# Altium schematic symbol library BARKO_SCHLIB.SchLib: 1064 symbols (part 3 of 11)
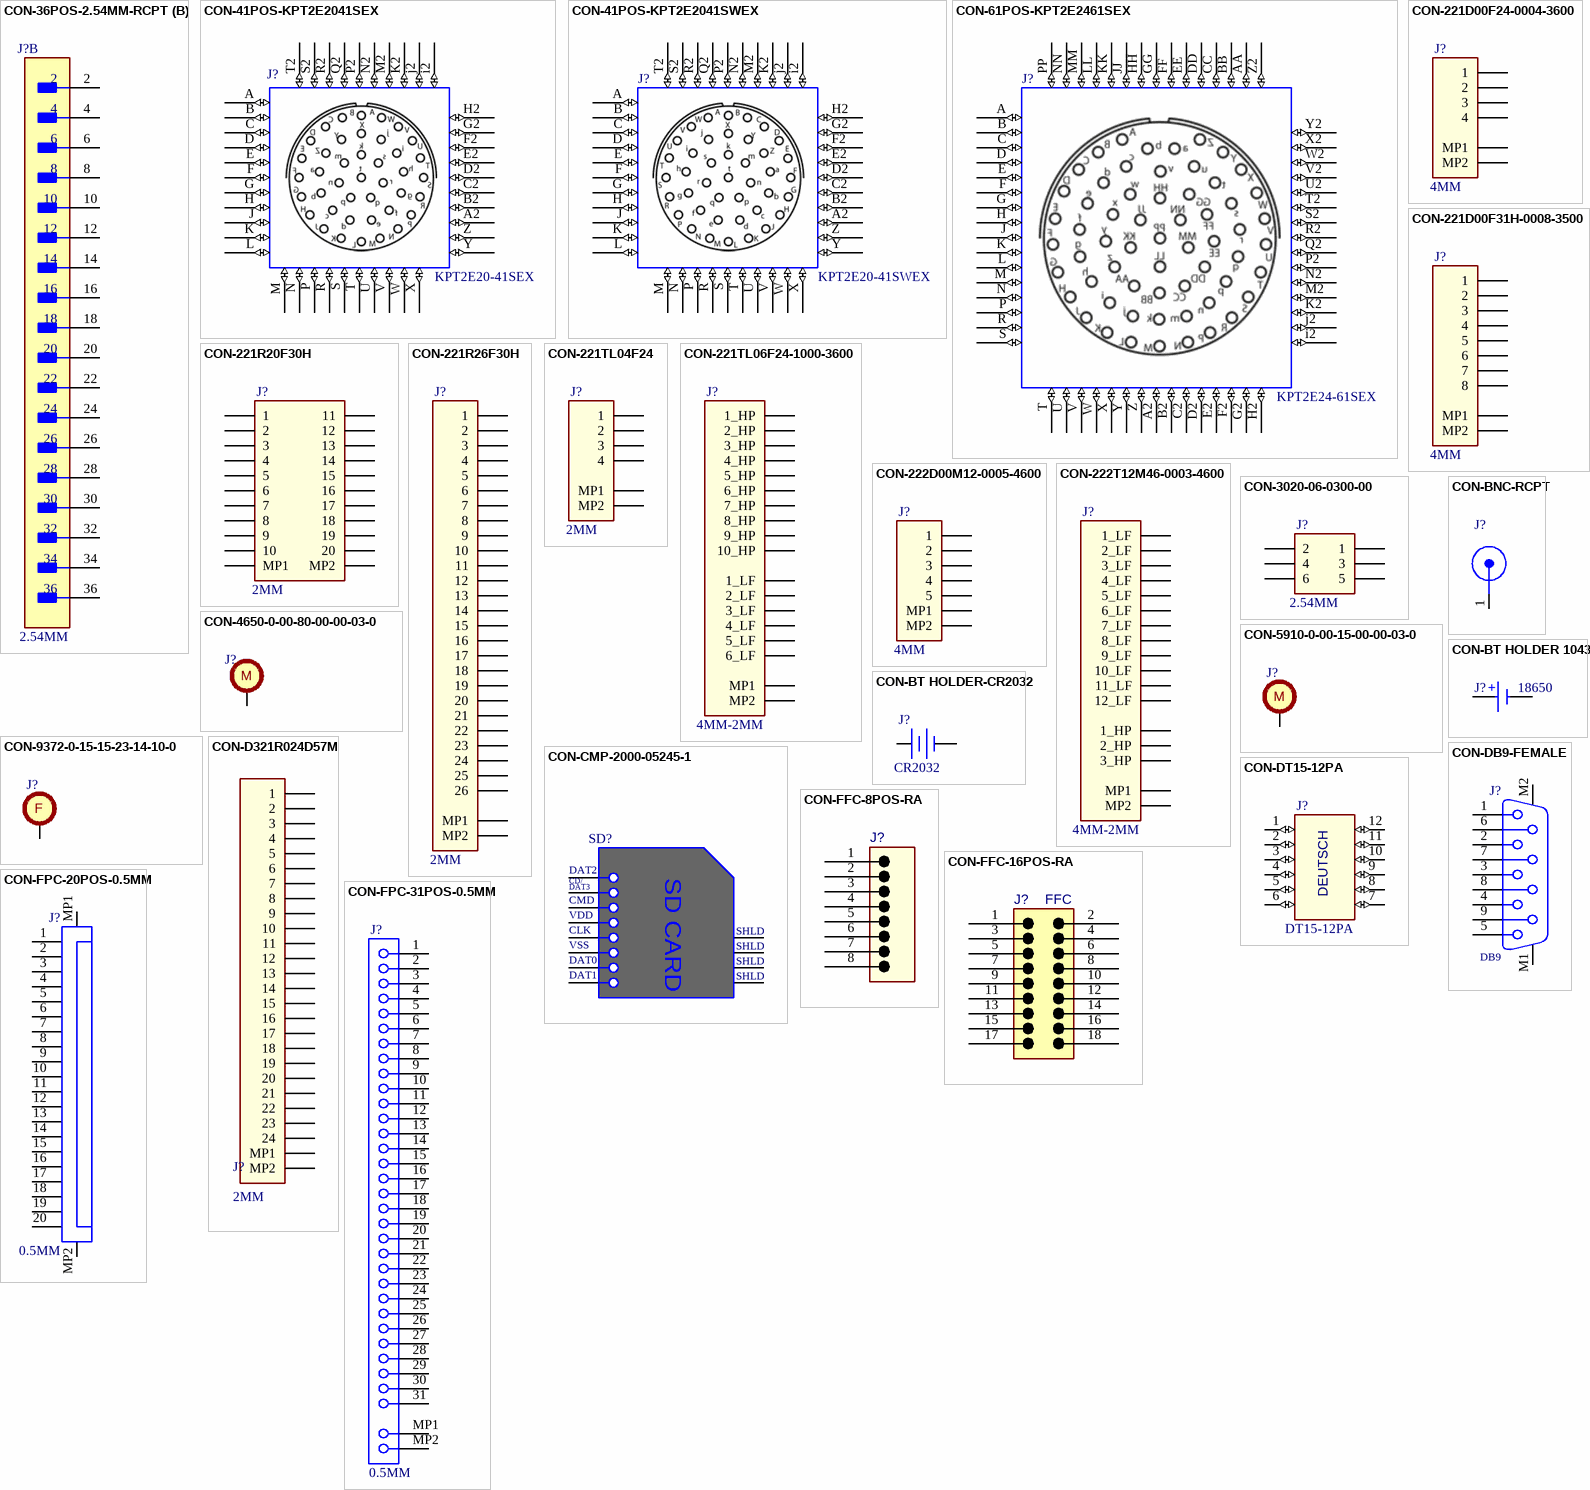
[diagram p43: symbols CON-36POS-2.54MM-RCPT to CON-FPC-31POS-0.5MM]

## CON-BNC-RCPT
designator J?, comment CONN BNC RCPT STR 75 OHM SOLDER  (value not drawn)
BNC Connector Jack, Female Socket 75Ohm Panel Mount Solder Cup; Manufacturer 1: Pomona Electronics; Manufacturer Part Number 1: 6736; Body Material: Brass; Plating: Nickel; Dielectric Material: PTFE; Voltage Rating: 500V; Connector Type: BNC,Socket,Plug,Coaxial; Polarity: Standard; Impedance: 75R; Max Frequency: 3GHz; Insulation Resistance: 5GR; Washability: OK; .Creator: M.OZKAN; .PCBCHK: USED; Supplier 1: Digi-Key; Stock 1: 290; Pricing 1: 1=6,49000, 25=6,16560, 50=5,84100, 100=5,58140 (USD); RoHS: Yes; Mount: Panel,Flanges,Bulkhead; Contact Plating: Gold; Contact Material: Copper,Brass; Body Plating: Nickel; Housing Color: Silver; Material: Brass; Insulation Material: Teflon; Housing Material: Brass; Min Operating Temperature: -65°C; Max Operating Temperature: 155°C; Package Quantity: 5; Gender: Female; Termination: Solder; Orientation: Vertical; Fastening Type: Bayonet; Packaging: Bulk; Frequency: 3GHz; REACH SVHC: No SVHC; Lead Free: Lead Free; ComponentLink1URL: https://datasheet.ciiva.com/644/d6735-6736-004-644064.pdf?src-supplier=Digi-Key; ComponentLink1Description: https://datasheet.ciiva.com/644/d6735-6736-004-644064.pdf?src-supplier=Digi-Key; ComponentLink2URL: https://datasheet.ciiva.com/7659/63814-7659204.pdf?src-supplier=Element14; ComponentLink2Description: https://datasheet.ciiva.com/7659/63814-7659204.pdf?src-supplier=Element14; ComponentLink3URL: https://datasheet.ciiva.com/14568/70197102-14568615.pdf?src-supplier=Allied+Electronics; ComponentLink3Description: https://datasheet.ciiva.com/14568/70197102-14568615.pdf?src-supplier=Allied+Electronics; ComponentLink4URL: https://datasheet.ciiva.com/5175/2391574-6735-36-54379-5175725.pdf?src-supplier=Mouser; ComponentLink4Description: https://datasheet.ciiva.com/5175/2391574-6735-36-54379-5175725.pdf?src-supplier=Mouser; Supplier Part Number 1: 501-1146-ND; .SCHCHK: USED
footprint CON-BNC
pins: 1

## CON-BT HOLDER 1043
designator J?, comment 18650
HOLDER BATTERY 1CELL 18650 TH; Manufacturer 1: Keystone Electronics; Manufacturer Part Number 1: 1043; Body Material: Nylon; Number of Cells: 1; Washability: OK; .Creator: M.OZKAN; .PCBCHK: USED; Supplier 1: Digi-Key; Supplier Part Number 1: 36-1043-ND; RoHS: Yes; Category: Uncategorized; Stock 1: 5416; Pricing 1: 1=2.58000, 25=2.16760, 100=1.91000, 250=1.82000, 500=1.67000, 1000=1.52000, 2500=1.30900, 5000=1.19000 (USD); Mount: Through Hole,PCB; Number of Pins: 1; Contact Material: Stainless Steel; Contact Plating: Gold; Material: Nylon; Min Operating Temperature: -50°C; Max Operating Temperature: 145°C; Packaging: Tray; Package Quantity: 50; Termination: PC Pin; ComponentLink1URL: https://datasheet.ciiva.com/4/1043-4710.pdf?src-supplier=Digi-Key; ComponentLink1Description: https://datasheet.ciiva.com/4/1043-4710.pdf?src-supplier=Digi-Key; ComponentLink2URL: https://datasheet.ciiva.com/3353/1043-eng-tds-3353208.pdf?src-supplier=Distrelec; ComponentLink2Description: https://datasheet.ciiva.com/3353/1043-eng-tds-3353208.pdf?src-supplier=Distrelec; ComponentLink3URL: https://datasheet.ciiva.com/4642/1043-4642493.pdf?src-supplier=Mouser; ComponentLink3Description: https://datasheet.ciiva.com/4642/1043-4642493.pdf?src-supplier=Mouser; ComponentLink4URL: https://datasheet.ciiva.com/41803/1043-41803215.pdf?src-supplier=Digi-Key; ComponentLink4Description: https://datasheet.ciiva.com/41803/1043-41803215.pdf?src-supplier=Digi-Key; .SCHCHK: USED
pins: 1 +, 2 -

## CON-BT HOLDER-CR2032
designator J?, comment CR2032
BATTERY RETAINER COIN 20MM SMD; Manufacturer: Keystone Electronics; Manufacturer Part Number: 3002; Body Material: Bronze; Number of Batteries: 1; Washability: OK; .Creator: M.OZKAN; .PCBCHK: USED; Supplier 1: Digi-Key; Stock 1: 15982; Pricing 1: 1=0.50000, 10=0.40900, 50=0.35880, 100=0.35250, 250=0.31184, 500=0.29302, 1000=0.27423, 2500=0.24915, 5000=0.23192 (USD); RoHS: Yes; Mount: Surface Mount; Material: Bronze; Contact Material: Bronze; Package Quantity: 100; Packaging: Bulk; Termination: SMD/SMT; Number of Cells: 1; Diameter: 20mm; Height: 3.96mm; REACH SVHC: No SVHC; Lead Free: Lead Free; ComponentLink1URL: https://datasheet.ciiva.com/20221/18-3570e-20221602.pdf?src-supplier=Rapid+Electronics; ComponentLink1Description: https://datasheet.ciiva.com/20221/18-3570e-20221602.pdf?src-supplier=Rapid+Electronics; ComponentLink2URL: https://datasheet.ciiva.com/3/3002-3958.pdf?src-supplier=Digi-Key; ComponentLink2Description: https://datasheet.ciiva.com/3/3002-3958.pdf?src-supplier=Digi-Key; ComponentLink3URL: https://datasheet.ciiva.com/11714/0900766b8002ef78-11714696.pdf?src-supplier=RSComponents; ComponentLink3Description: https://datasheet.ciiva.com/11714/0900766b8002ef78-11714696.pdf?src-supplier=RSComponents; ComponentLink4URL: https://datasheet.ciiva.com/1391/1718263-1391631.pdf?src-supplier=Element14; ComponentLink4Description: https://datasheet.ciiva.com/1391/1718263-1391631.pdf?src-supplier=Element14; ComponentLink5URL: https://datasheet.ciiva.com/3353/06950232-3353157.pdf?src-supplier=Distrelec; ComponentLink5Description: https://datasheet.ciiva.com/3353/06950232-3353157.pdf?src-supplier=Distrelec; ComponentLink6URL: https://datasheet.ciiva.com/14603/70182864-14603662.pdf?src-supplier=Allied+Electronics; ComponentLink6Description: https://datasheet.ciiva.com/14603/70182864-14603662.pdf?src-supplier=Allied+Electronics; Supplier Part Number 1: 36-3002-ND; .SCHCHK: USED
footprint CR2032-SMD (COIN HOLDER)
pins: 1 1,3, 2, 3

## CON-CMP-2000-05245-1
designator SD?, comment L-KLS1-TF-007-H1.8-R  (value not drawn)
CONN MICRO SD CARD HINGED TYPE; Manufacturer: Molex; Manufacturer Part Number: 47219-2001; Number of Contacts: 8; Current Rating: 500mA; Voltage Rating (DC): 100V; Gender: Female; Shielding: Shielded; Pitch: 1.09mm; Washability: OK; .Creator: M.OZKAN; .PCBCHK: USED; ComponentLink1URL: https://datasheet.ciiva.com/24444/260460472192001-memory-card-socket-24444480.pdf?src-supplier=Onlinecomponents.com; ComponentLink1Description: https://datasheet.ciiva.com/24444/260460472192001-memory-card-socket-24444480.pdf?src-supplier=Onlinecomponents.com; ComponentLink2URL: https://datasheet.ciiva.com/30153/0472192001-memory-card-socket-30153816.pdf?src-supplier=Onlinecomponents.com; ComponentLink2Description: https://datasheet.ciiva.com/30153/0472192001-memory-card-socket-30153816.pdf?src-supplier=Onlinecomponents.com; ComponentLink3URL: https://datasheet.ciiva.com/16655/0472192001-memory-card-socket-16655591.pdf?src-supplier=Avnet+Europe; ComponentLink3Description: https://datasheet.ciiva.com/16655/0472192001-memory-card-socket-16655591.pdf?src-supplier=Avnet+Europe; Supplier 1: Digi-Key; Stock 1: 29756; Pricing 1: 1=1.16000, 10=1.02200, 25=0.96160, 50=0.92140, 100=0.88140, 250=0.80124 (USD); RoHS: Yes; Mount: Surface Mount; Contact Material: Copper Alloy; Contact Plating: Gold; Housing Material: Thermoplastic; Color: Black; Material: Thermoplastic; Min Operating Temperature: -20°C; Max Operating Temperature: 85°C; Orientation: Right Angle; Packaging: Tape and Reel; Package Quantity: 2400; Termination: SMD/SMT; Number of Circuits: 8; Length: 13.6mm; Depth: 1.9mm; Width: 14.5mm; Radiation Hardening: No; REACH SVHC: No SVHC; Lead Free: Lead Free; Halogen Free: Low Halogen; ELV: Compliant; Supplier Part Number 1: WM6698CT-ND; .SCHCHK: USED
footprint MOLX-47219-2001-8_V (Footprint not found)
pins: 1 DAT2, 2 CD/DAT3, 3 CMD, 4 VDD, 5 CLK, 6 VSS, 7 DAT0, 8 DAT1, 9 SHLD, 10 SHLD, 11 SHLD, 12 SHLD
text: SD CARD; CD/; DAT3

## CON-D321R024D57M
designator J?, comment 2MM
DMM 320 MALE 90° SMT; Manufacturer: NICOMATIC; Manufacturer Part Number: D321R024D57M; Mating: D322SP024D53
footprint CON-D321R024D57M
pins: 1, 2, 3, 4, 5, 6, 7, 8, 9, 10, 11, 12, 13, 14, 15, 16, 17, 18, 19, 20, 21, 22, 23, 24, MP1, MP2

## CON-DB9-FEMALE
designator J?, comment DB9
WR-DSUB FEMALE ANGLED PCB CONNEC; Manufacturer: Wurth Electronics; Manufacturer Part Number: 618009211821; ComponentLink1Description: Manufacturer; ComponentLink1URL: http://www.we-online.de; ComponentLink2Description: Datasheet; ComponentLink2URL: https://katalog.we-online.de/em/datasheet/6180xx211821.pdf; Supplier 1: Digi-Key; Supplier Part Number 1: 732-618009211821-ND; Stock: 78; Pricing: 1=2.47, 10=2.343, 50=2.081, 100=1.815, 250=1.557, 500=1.387 (USD); RoHS: No
footprint CON-DB9-618009211821 (09p 8.08mm bracket, board lock & UNC4-40 Rivet without hex screw)
pins: 1, 2, 3, 4, 5, 6, 7, 8, 9, M1, M2

## CON-DT15-12PA
designator J?, comment DT15-12PA
CONN HEADER VERT 12POS 4.44MM; Manufacturer: TE Connectivity Deutsch; Connector System: Wire-to-Device; Hybrid Connector: No; Number of Positions: 12; Sealable: Yes (With); Strain Relief: No (Without); Pitch: 0.175inch; Row Spacing: 0.359inch; Supplier 1: Digi-Key; Supplier Part Number 1: 1734-1027-ND; Manufacturer Part Number: DT15-12PA; Stock: 1401; Pricing: 1=11.11, 10=10.626, 25=9.66, 50=9.177, 100=8.9355, 250=7.9695, 500=7.4865, 1000=6.6171, 2500=6.279 (USD); RoHS: No; Housing Material: Thermoplastic; Housing Color: Grey; Contact Material: Copper Alloy; Color: Grey; Contact Plating: Nickel; Min Operating Temperature: -55°C; Max Operating Temperature: 125°C; Number of Rows: 2; Polarized: No; Serviceable: No; Orientation: Straight; Length: 59.21mm; Height: 30.12mm; Width: 35.26mm; Flammability Rating: UL94 V-0; ELV: Compliant; ComponentLink1URL: https://www.te.com/commerce/DocumentDelivery/DDEController?Action=srchrtrv&DocNm=DT15-12PX&DocType=Customer+Drawing&DocLang=English&src-supplier=Digi-Key; ComponentLink1Description: https://www.te.com/commerce/DocumentDelivery/DDEController?Action=srchrtrv&DocNm=DT15-12PX&DocType=Customer+Drawing&DocLang=English&src-supplier=Digi-Key
footprint CON-DT15-12A (12 Position 4.44mm)
pins: 1 (io), 2 (io), 3 (io), 4 (io), 5 (io), 6 (io), 7 (io), 8 (io), 9 (io), 10 (io), 11 (io), 12 (io)
text: DEUTSCH

## CON-FFC-8POS-RA
designator J?  (value not drawn)
CONN FFC FPC TOP 8POS 1.00MM R/A; Manufacturer: Molex; Manufacturer Part Number: 52207-0860; Current Rating: 1A; Voltage Rating: 125V; Contact Resistance: 20mR; Number of Positions: 8; Gender: Receptacle; Stackable: No; Pitch: 1mm; .PCBCHK: USED; .Creator: F:TALI; Washability: OK; Supplier 1: Digi-Key; Stock 1: 21484; Pricing 1: 1=1.17, 10=1.028, 25=0.9672, 50=0.927, 100=0.8867, 250=0.80608, 500=0.72548 (USD); Contact Material: Bronze; Contact Plating: Gold; Housing Material: Nylon; Material: Bronze; Min Operating Temperature: -20°C; Max Operating Temperature: 85°C; Number of Rows: 1; Package Quantity: 1000; Packaging: Tape and Reel; Termination: Solder; Number of Contacts: 8; Orientation: Right Angle; Number of Circuits: 8; Length: 15.5mm; Depth: 7.5mm; Flammability Rating: UL94 V-0; REACH SVHC: Unknown; ELV: Compliant; ComponentLink1URL: http://uk.rs-online.com/webdocs/13c4/0900766b813c4266.pdf; ComponentLink1Description: http://uk.rs-online.com/webdocs/13c4/0900766b813c4266.pdf; ComponentLink2URL: http://www.onlinecomponents.com/productFiles/mf-MOL/408160522070860_ffc_fpc_nectors.pdf; ComponentLink2Description: http://www.onlinecomponents.com/productFiles/mf-MOL/408160522070860_ffc_fpc_nectors.pdf; ComponentLink3URL: http://www.mouser.com/ds/2/276/0522070860_FFC_FPC_CONNECTORS-149496.pdf; ComponentLink3Description: http://www.mouser.com/ds/2/276/0522070860_FFC_FPC_CONNECTORS-149496.pdf; ComponentLink4URL: http://www.farnell.com/datasheets/2133202.pdf; ComponentLink4Description: http://www.farnell.com/datasheets/2133202.pdf; ComponentLink5URL: https://www.verical.com/server-webapp/html/getDatasheet?partID=761365; ComponentLink5Description: https://www.verical.com/server-webapp/html/getDatasheet?partID=761365; ComponentLink6URL: http://www.molex.com/webdocs/datasheets/pdf/en-us/0522070860_FFC_FPC_CONNECTORS.pdf; ComponentLink6Description: http://www.molex.com/webdocs/datasheets/pdf/en-us/0522070860_FFC_FPC_CONNECTORS.pdf; Supplier Part Number 1: WM3375DKR-ND; .SCHCHK: USED
pins: 1, 2, 3, 4, 5, 6, 7, 8

## CON-FFC-16POS-RA
designator J?, comment FFC
CONN FFC FPC TOP 16POS 1.00MM R/A; Manufacturer: TE Connectivity; Manufacturer Part Number: 1-84953-6; .PCBCHK: USED; .Creator: F:TALI; Body Plating: Tin; Contact Current Rating: 1A; Connector Type: Receptacle; Wire/Cable Type: Flat Flex; Connector System: Flex-to-Board; Plating Thickness: 2um; Number of Positions: 16; Mating Alignment: Yes (With); PCB Mount Alignment: No (Without); PCB Mount Retention: With; PCB Mounting Orientation: Right Angle; Gender: Female; Shielding: Unshielded; Voltage Rating: 200V; Pitch: 0.039inch; .SCHCHK: USED; Supplier 1: Digi-Key; Supplier Part Number 1: A100322CT-ND; Stock: 10507; Pricing: 1=1.72, 10=1.56, 25=1.4648, 50=1.401, 100=1.3373, 250=1.2099, 500=1.1144 (USD); Mount: Surface Mount; Housing Color: Natural; Material: Thermoplastic; Contact Material: Bronze; Contact Plating: Tin; Color: Natural; Housing Material: Polymer; Min Operating Temperature: -40°C; Max Operating Temperature: 85°C; Orientation: Right Angle; Termination: SMD/SMT; Contact Location: Top; Sealable: No (Without); Number of Contacts: 16; Shrouded: Yes (With); Number of Rows: 1; Packaging: Tape and Reel; Package Quantity: 1200; Current Rating: 1A; Length: 0.9417inch; Height: 2.56mm; Depth: 5.4mm; Lead Pitch: 1mm; Width: 0.2575inch; Radiation Hardening: No; REACH SVHC: Unknown; ELV: Compliant; Lead Free: Lead Free; Flammability Rating: UL94 V-0; ComponentLink1URL: https://datasheet.ciiva.com/11745/0900766b806c61ee-11745312.pdf?src-supplier=RSComponents; ComponentLink1Description: https://datasheet.ciiva.com/11745/0900766b806c61ee-11745312.pdf?src-supplier=RSComponents; ComponentLink2URL: https://datasheet.ciiva.com/669/eng-cd-84953-a3-669481.pdf?src-supplier=Digi-Key; ComponentLink2Description: https://datasheet.ciiva.com/669/eng-cd-84953-a3-669481.pdf?src-supplier=Digi-Key; ComponentLink3URL: https://datasheet.ciiva.com/1437/586796-1437401.pdf?src-supplier=Element14; ComponentLink3Description: https://datasheet.ciiva.com/1437/586796-1437401.pdf?src-supplier=Element14; ComponentLink4URL: https://datasheet.ciiva.com/14483/eng-ds-1-1773440-6-0506-14483305.pdf?src-supplier=Farnell; ComponentLink4Description: https://datasheet.ciiva.com/14483/eng-ds-1-1773440-6-0506-14483305.pdf?src-supplier=Farnell; ComponentLink5URL: https://datasheet.ciiva.com/669/eng-cd-84953-a3-669482.pdf?src-supplier=Digi-Key; ComponentLink5Description: https://datasheet.ciiva.com/669/eng-cd-84953-a3-669482.pdf?src-supplier=Digi-Key; ComponentLink6URL: https://datasheet.ciiva.com/1437/586796-1437402.pdf?src-supplier=Element14; ComponentLink6Description: https://datasheet.ciiva.com/1437/586796-1437402.pdf?src-supplier=Element14; ComponentLink7URL: https://datasheet.ciiva.com/669/eng-cd-84953-a3-669483.pdf?src-supplier=Digi-Key; ComponentLink7Description: https://datasheet.ciiva.com/669/eng-cd-84953-a3-669483.pdf?src-supplier=Digi-Key; ComponentLink8URL: https://datasheet.ciiva.com/30233/eng-ds-1-1773440-6-0506-30233935.pdf?src-supplier=Onlinecomponents.com; ComponentLink8Description: https://datasheet.ciiva.com/30233/eng-ds-1-1773440-6-0506-30233935.pdf?src-supplier=Onlinecomponents.com; ComponentLink9URL: https://datasheet.ciiva.com/16546/eng-ds-1-1773440-6-0506-16546839.pdf?src-supplier=Avnet+Europe; ComponentLink9Description: https://datasheet.ciiva.com/16546/eng-ds-1-1773440-6-0506-16546839.pdf?src-supplier=Avnet+Europe; ComponentLink10URL: http://datasheet.octopart.com/1-84953-6-TE-Connectivity-datasheet-502047.pdf?src-supplier=Electro+Sonic; ComponentLink10Description: http://datasheet.octopart.com/1-84953-6-TE-Connectivity-datasheet-502047.pdf?src-supplier=Electro+Sonic; ComponentLink11URL: http://sigma.octopart.com/13533106/technical_drawing/TE-Connectivity-1-84953-6.pdf?src-supplier=TE+Connectivity; ComponentLink11Description: http://sigma.octopart.com/13533106/technical_drawing/TE-Connectivity-1-84953-6.pdf?src-supplier=TE+Connectivity; ComponentLink12URL: http://datasheet.octopart.com/1-84953-6-TE-Connectivity-datasheet-17451040.pdf?src-supplier=TE+Connectivity; ComponentLink12Description: http://datasheet.octopart.com/1-84953-6-TE-Connectivity-datasheet-17451040.pdf?src-supplier=TE+Connectivity; ComponentLink13URL: http://datasheet.octopart.com/1-84953-6-TE-Connectivity-datasheet-137167967.pdf?src-supplier=TE+Connectivity; ComponentLink13Description: http://datasheet.octopart.com/1-84953-6-TE-Connectivity-datasheet-137167967.pdf?src-supplier=TE+Connectivity; ComponentLink14URL: http://datasheet.octopart.com/1-84953-6-Tyco-Electronics-datasheet-513267.pdf?src-supplier=Element14; ComponentLink14Description: http://datasheet.octopart.com/1-84953-6-Tyco-Electronics-datasheet-513267.pdf?src-supplier=Element14; ComponentLink15URL: http://datasheet.octopart.com/1-84953-6-Tyco-Electronics-datasheet-5316480.pdf?src-supplier=Farnell; ComponentLink15Description: http://datasheet.octopart.com/1-84953-6-Tyco-Electronics-datasheet-5316480.pdf?src-supplier=Farnell; ComponentLink16URL: http://datasheet.octopart.com/1-84953-6-Tyco-Electronics-datasheet-13694045.pdf?src-supplier=Farnell; ComponentLink16Description: http://datasheet.octopart.com/1-84953-6-Tyco-Electronics-datasheet-13694045.pdf?src-supplier=Farnell; ComponentLink17URL: http://datasheet.octopart.com/1-84953-6-Tyco-Electronics-datasheet-537331.pdf?src-supplier=Farnell; ComponentLink17Description: http://datasheet.octopart.com/1-84953-6-Tyco-Electronics-datasheet-537331.pdf?src-supplier=Farnell; ComponentLink18URL: http://datasheet.octopart.com/1-84953-6-Tyco-Electronics-datasheet-542113.pdf?src-supplier=Farnell; ComponentLink18Description: http://datasheet.octopart.com/1-84953-6-Tyco-Electronics-datasheet-542113.pdf?src-supplier=Farnell
footprint CON-FFC-16X1-1MM
pins: 1, 2, 3, 4, 5, 6, 7, 8, 9, 10, 11, 12, 13, 14, 15, 16, 17 27, 18

## CON-FPC-20POS-0.5MM
designator J?, comment 0.5MM
CONN FFC TOP 20POS 0.5MM SMD R/A; Manufacturer: Wurth Electronics; Manufacturer Part Number: 687120183622; Actuator Material: Nylon,Polyamide; Wire/Cable Type: Straight; Number of Positions: 20; Current Rating: 400mA; Supplier 1: Digi-Key; Supplier Part Number 1: 732-11341-1-ND; Stock: 3090; Pricing: 1=2.31, 10=1.93, 100=1.69, 1000=1.54 (USD); RoHS: No; Mount: Surface Mount; Contact Material: Bronze; Contact Plating: Tin; Housing Material: Polymer; Housing Color: Beige; Min Operating Temperature: -25°C; Max Operating Temperature: 85°C; Packaging: Tape and Reel; Termination: Solder; Mating Cycles: 20; Flammability Rating: UL94 V-0; ComponentLink1URL: https://media.digikey.com/pdf/Data%20Sheets/Wurth%20Electronics%20PDFs/WR-FPC_FFC_Flyer.pdf?src-supplier=Digi-Key; ComponentLink1Description: https://media.digikey.com/pdf/Data%20Sheets/Wurth%20Electronics%20PDFs/WR-FPC_FFC_Flyer.pdf?src-supplier=Digi-Key; ComponentLink2URL: https://katalog.we-online.de/em/datasheet/687120183622.pdf?src-supplier=Digi-Key; ComponentLink2Description: https://katalog.we-online.de/em/datasheet/687120183622.pdf?src-supplier=Digi-Key
footprint CON-FPC-20POS-0.5MM (ZIF Connectors, Horizontal, Top Contact Low Profile, pitch 0.5mm, 20p)
pins: 1, 2, 3, 4, 5, 6, 7, 8, 9, 10, 11, 12, 13, 14, 15, 16, 17, 18, 19, 20, MP1, MP2

## CON-FPC-31POS-0.5MM
designator J?, comment 0.5MM
CONN FPC TOP 31POS 0.50MM R/A; Manufacturer: Amphenol FCI; Manufacturer Part Number: SFV31R-4STE1HLF; Actuator Material: Glass,Polyphenylene; Voltage Rating: 50V; Current Rating: 500mA; Number of Positions: 31; Insulation Resistance: 100MR; Pitch: 0.02inch; .Creator: M.OZKAN; .PCBCHK: USED; Supplier 1: Digi-Key; Supplier Part Number 1: SFV31R-4STE1HLF-ND; Stock: 0; Pricing: 6000=0.2513 (USD); RoHS: Yes; Mount: Surface Mount; Housing Material: Polymer; Contact Material: Bronze; Contact Plating: Tin; Min Operating Temperature: -55°C; Max Operating Temperature: 105°C; Package Quantity: 3000; Packaging: Tape and Reel; Termination: Solder; Contact Location: Top; Flammability Rating: UL94 V-0; ComponentLink1URL: https://datasheet.ciiva.com/18563/10117319-18563813.pdf?src-supplier=Digi-Key; ComponentLink1Description: https://datasheet.ciiva.com/18563/10117319-18563813.pdf?src-supplier=Digi-Key; .SCHCHK: USED
pins: 1, 2, 3, 4, 5, 6, 7, 8, 9, 10, 11, 12, 13, 14, 15, 16, 17, 18, 19, 20, 21, 22, 23, 24, 25, 26, 27, 28, 29, 30, 31, MP1, MP2

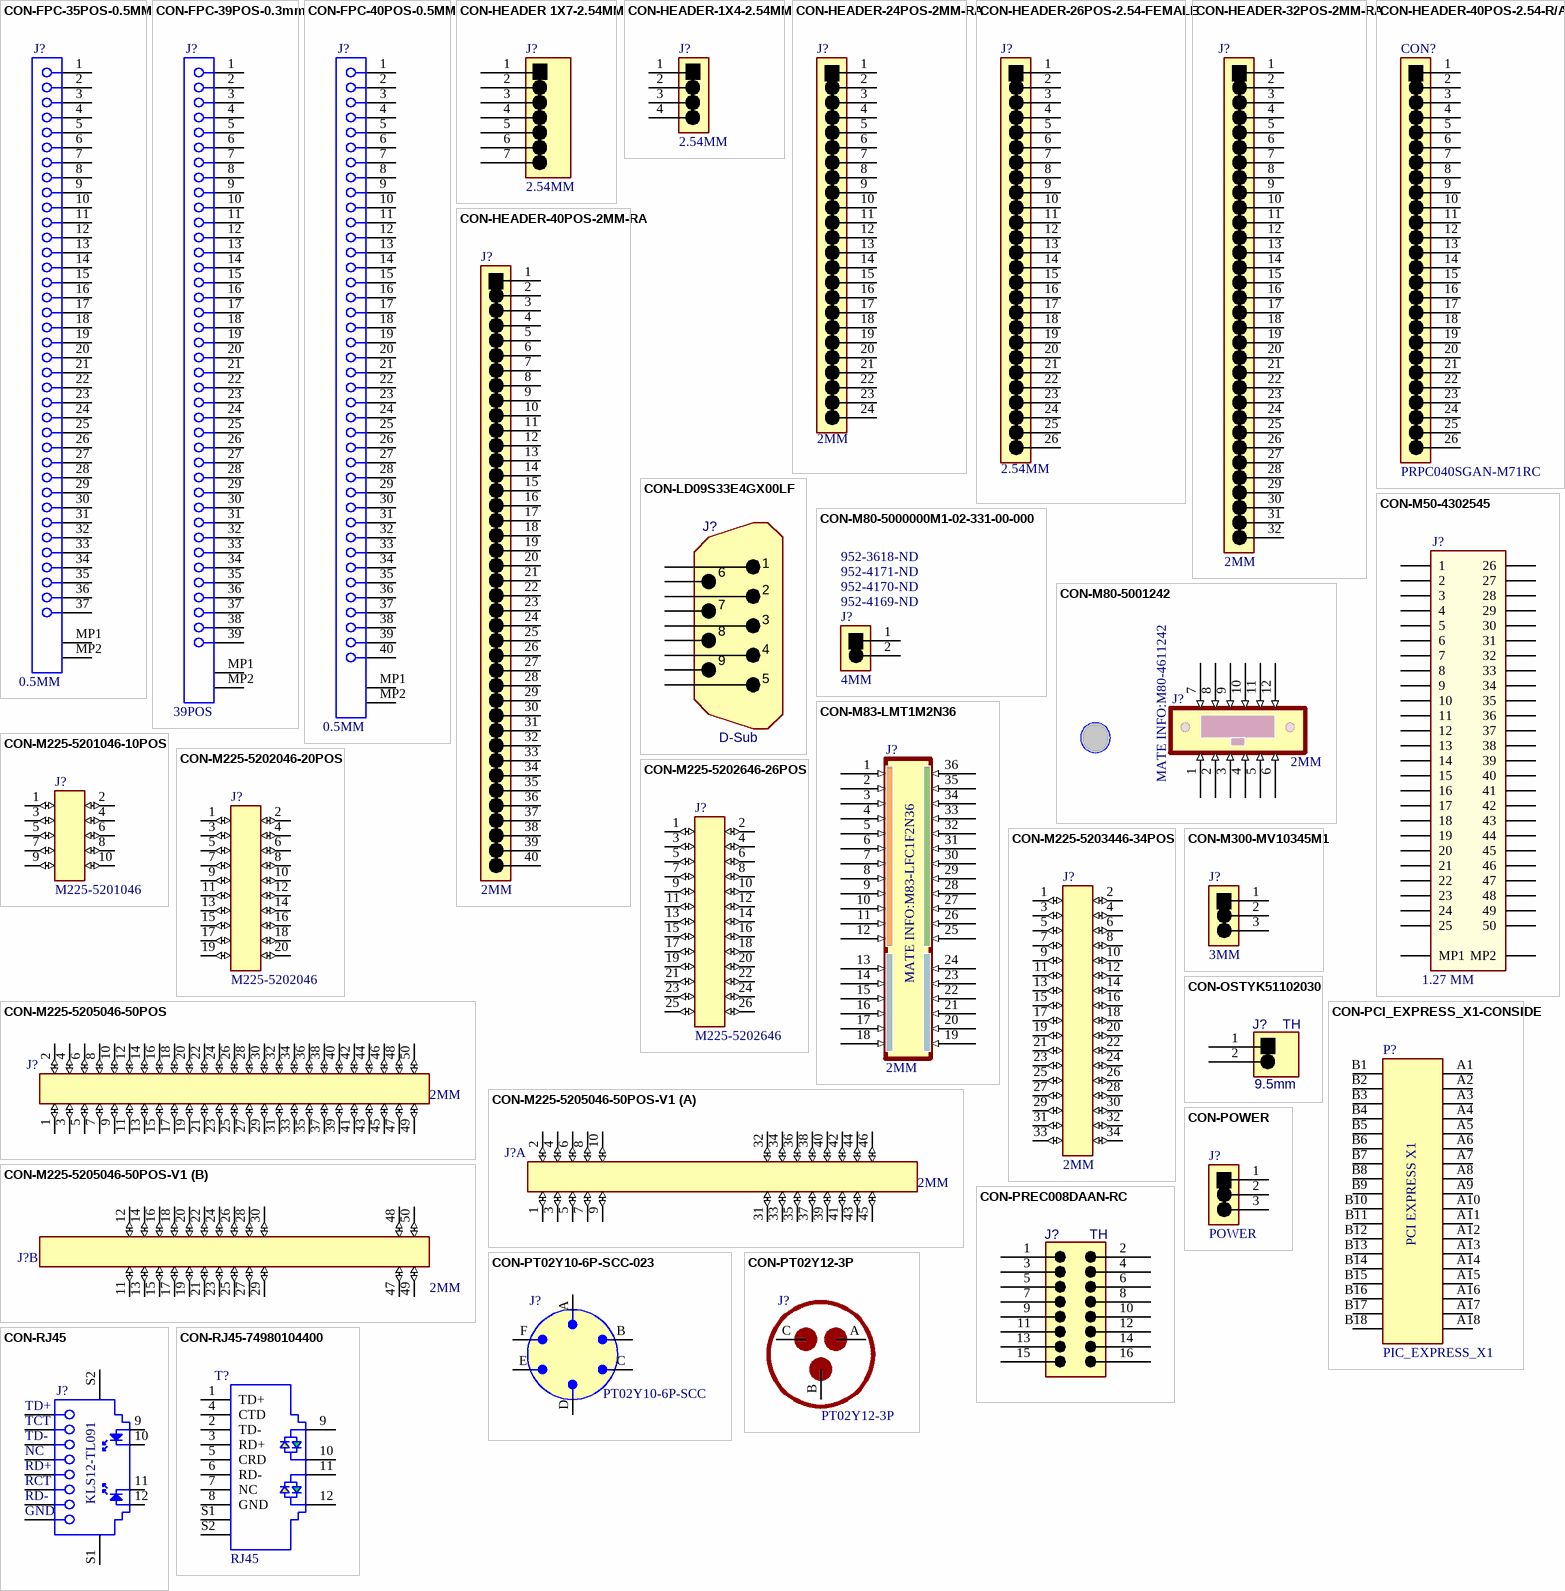
[diagram p8: symbols CON-FPC-35POS-0.5MM to CON-RJ45-74980104400]

## CON-FPC-35POS-0.5MM
designator J?, comment 0.5MM
CONN FFC TOP 35POS 0.50MM R/A; Manufacturer: Amphenol FCI; Manufacturer Part Number: SFV35R-2STBE1HLF; Actuator Material: Glass,Polyphenylene; Number of Positions: 35; Insulation Resistance: 100MR; Wire/Cable Type: Straight; Voltage Rating: 50V; Current Rating: 500mA; .Creator: M.OZKAN; .PCBCHK: USED; Supplier 1: Mouser; Supplier Part Number 1: 649-SFV35R-2STBE1HLF; Stock: 5813; Pricing: 1=0.6, 10=0.443, 100=0.424, 500=0.369, 1000=0.304, 3000=0.277 (USD); RoHS: Yes; Mount: Surface Mount; Contact Material: Bronze; Contact Plating: Gold; Housing Material: Polymer; Min Operating Temperature: -55°C; Max Operating Temperature: 105°C; Termination: Solder; Contact Location: Top; Packaging: Tape and Reel; Number of Rows: 1; Package Quantity: 3000; Orientation: Right Angle; Pitch: 0.5mm; Flammability Rating: UL94 V-0; ComponentLink1URL: https://datasheet.ciiva.com/15249/ecatalogappnamecatdisplaystyledomproductquerynamesfv35r-2stbe1hlf-15249059.pdf?src-supplier=Arrow+Europe; ComponentLink1Description: https://datasheet.ciiva.com/15249/ecatalogappnamecatdisplaystyledomproductquerynamesfv35r-2stbe1hlf-15249059.pdf?src-supplier=Arrow+Europe; ComponentLink2URL: https://datasheet.ciiva.com/48769/sfv12b-hlf-48769990.pdf?src-supplier=Avnet; ComponentLink2Description: https://datasheet.ciiva.com/48769/sfv12b-hlf-48769990.pdf?src-supplier=Avnet; .SCHCHK: USED
footprint CON-FPC-35POS-0.5mm (FPC Connector, 35-Leads, Right Angle, Pitch 0.5 mm, Mated Height 2.0 mm, SMT)
pins: 1, 2, 3, 4, 5, 6, 7, 8, 9, 10, 11, 12, 13, 14, 15, 16, 17, 18, 19, 20, 21, 22, 23, 24, 25, 26, 27, 28, 29, 30, 31, 32, 33, 34, 35, 36, 37, MP1, MP2

## CON-FPC-39POS-0.3mm
designator J?, comment 39POS
CONN FPC BOTTOM 39POS 0.30MM R/A; Manufacturer: Amphenol FCI; Manufacturer Part Number: 10061122-391420HLF; Actuator Material: Thermoplastic; Number of Contacts: 39; Voltage Rating: 30V; Current Rating: 200mA; Contact Resistance: 100mR; Pitch: 0.3mm; Supplier 1: Digi-Key; Supplier Part Number 1: 609-10061122-391420HLFCT-ND; Stock: 4998; Pricing: 1=0.49, 10=0.461, 25=0.4152, 50=0.3692, 100=0.3537, 250=0.323, 500=0.3076, 1000=0.2538, 2500=0.2307 (USD); RoHS: Yes; Mount: Surface Mount; Housing Color: Black; Contact Material: Copper Alloy; Housing Material: Thermoplastic; Contact Plating: Gold; Min Operating Temperature: -55°C; Max Operating Temperature: 85°C; Orientation: Right Angle; Termination: Solder; Number of Rows: 1; Number of Positions: 39; Packaging: Tape and Reel; Package Quantity: 5000; Length: 13.5mm; Depth: 3.5mm; Radiation Hardening: No; Flammability Rating: UL94 V-0; ComponentLink1URL: https://datasheet.ciiva.com/10369/10061122-10369232.pdf?src-supplier=Avnet; ComponentLink1Description: https://datasheet.ciiva.com/10369/10061122-10369232.pdf?src-supplier=Avnet; ComponentLink2URL: https://datasheet.ciiva.com/18491/10061122-18491997.pdf?src-supplier=Digi-Key; ComponentLink2Description: https://datasheet.ciiva.com/18491/10061122-18491997.pdf?src-supplier=Digi-Key
footprint CON-FPC-39POS-0.3mm (FPC Connector, 39-Leads, Right Angle, Pitch 0.3 mm, Mated Height 0.9 mm, SMT)
pins: 1, 2, 3, 4, 5, 6, 7, 8, 9, 10, 11, 12, 13, 14, 15, 16, 17, 18, 19, 20, 21, 22, 23, 24, 25, 26, 27, 28, 29, 30, 31, 32, 33, 34, 35, 36, 37, 38, 39, MP1, MP2

## CON-FPC-40POS-0.5MM
designator J?, comment 0.5MM
CONN FFC BOTTOM 40POS 0.50MM R/A; Manufacturer: Molex; Manufacturer Part Number: DS1020-09-40VBT1A; Actuator Material: Glass,Polyphenylene; Contact Resistance: 20mR; Current Rating: 500mA; Voltage Rating: 50V; Number of Positions: 40; Wire/Cable Type: Straight; Mating Cycles: 20; Supplier 1: Digi-Key; Supplier Part Number 1: WM3436CT-ND; Stock: 15140; Pricing: 1=2.15, 10=1.954, 25=1.8344, 50=1.7548, 100=1.675, 250=1.5154, 500=1.3958 (USD); RoHS: Yes; Mount: Surface Mount; Contact Material: Bronze; Contact Plating: Gold; Housing Color: Black; Housing Material: Nylon; Min Operating Temperature: -20°C; Max Operating Temperature: 85°C; Number of Rows: 1; Packaging: Tape and Reel; Package Quantity: 1; Termination: Solder; Number of Contacts: 40; Orientation: Right Angle; Length: 25.5mm; Pitch: 0.5mm; Depth: 5.6mm; Flammability Rating: UL94 V-0; ComponentLink1URL: https://datasheet.ciiva.com/671/541323062-sd-671324.pdf?src-supplier=Digi-Key; ComponentLink1Description: https://datasheet.ciiva.com/671/541323062-sd-671324.pdf?src-supplier=Digi-Key; ComponentLink2URL: https://datasheet.ciiva.com/671/541324062-sd-671416.pdf?src-supplier=Digi-Key; ComponentLink2Description: https://datasheet.ciiva.com/671/541324062-sd-671416.pdf?src-supplier=Digi-Key; ComponentLink3URL: https://datasheet.ciiva.com/671/541324062-sd-671417.pdf?src-supplier=Digi-Key; ComponentLink3Description: https://datasheet.ciiva.com/671/541324062-sd-671417.pdf?src-supplier=Digi-Key
footprint CON-FPC-40P-0.5MM (FPC Connector, 40-Leads, Right Angle, Pitch 0.5 mm, Mated Height 2.0 mm, SMT)
pins: 1, 2, 3, 4, 5, 6, 7, 8, 9, 10, 11, 12, 13, 14, 15, 16, 17, 18, 19, 20, 21, 22, 23, 24, 25, 26, 27, 28, 29, 30, 31, 32, 33, 34, 35, 36, 37, 38, 39, 40, MP1, MP2

## CON-HEADER 1X7-2.54MM
designator J?, comment 2.54MM
CON HEADER 1X7 2.54MM PITCH; .Creator: F:TALI; .PCBCHK: USED; Washability: OK; .SCHCHK: USED
footprint CON-HEADER-1X7-2.54MM
pins: 1 GND_IN, 2, 3, 4, 5, 6, 7

## CON-HEADER-1X4-2.54MM
designator J?, comment 2.54MM
CON HEADER 1X4 2.54MM PITCH; .Creator: F:TALI; .PCBCHK: USED; Washability: OK; .SCHCHK: USED
footprint CON-HEADER-1X4-2.54MM
pins: 1 GND_IN, 2, 3, 4

## CON-HEADER-24POS-2MM-RA
designator J?, comment 2MM
CONN HEADER R/A 24POS 2MM; Manufacturer: Sullins; Manufacturer Part Number: NRPN401PARN-RC; Connector Type: Male Pin; Number of Positions: 40; Pitch: 0.079inch; Washability: OK; .Creator: M.OZKAN; .PCBCHK: USED; Supplier 1: Digi-Key; Stock 1: 2838; Pricing 1: 1=2,38000, 10=2,13000, 100=1,75390, 500=1,38644, 1000=1,20640 (USD); RoHS: Yes; Mount: Through Hole; Color: Black; Contact Plating: Gold; Package Quantity: 1000; Number of Rows: 1; Packaging: Bulk; Termination: Solder; Contact Mating Length: 0.157inch; ComponentLink1URL: http://www.sullinscorp.com/catalogs/74_PAGE100-101_2mm_MALE_HDR_ST_RA_SMT.pdf?src-supplier=Digi-Key; ComponentLink1Description: http://www.sullinscorp.com/catalogs/74_PAGE100-101_2mm_MALE_HDR_ST_RA_SMT.pdf?src-supplier=Digi-Key; Supplier Part Number 1: S5802-40-ND; .SCHCHK: USED
footprint CON-HEADER-2MM-20POS-RA
pins: 1, 2, 3, 4, 5, 6, 7, 8, 9, 10, 11, 12, 13, 14, 15, 16, 17, 18, 19, 20, 21, 22, 23, 24

## CON-HEADER-26POS-2.54-FEMALE
designator J?, comment 2.54MM
CONN RCPT .100 26POS TIN T/H; Manufacturer: Samtec; Manufacturer Part Number: SS-126-TT-2; Number of Contacts: 26; Gender: Female; Connector Type: Receptacle; Pitch: 0.1inch; Washability: OK; .Creator: M.OZKAN; .PCBCHK: USED; Supplier 1: Mouser; Stock 1: 0; Pricing 1: 1=2,25000, 10=1,85000, 100=1,39000, 250=1,31000, 500=1,16000, 1000=1,03000 (USD); RoHS: Yes; Mount: Through Hole; Contact Plating: Tin; Contact Material: Copper; Housing Material: Plastic; Color: Black; Housing Color: Black; Number of Rows: 1; Termination: Solder; Packaging: Bulk; Number of Positions: 26; Package Quantity: 1; Length: 66mm; Height: 2.54mm; Width: 2.54mm; Lead Free: Lead Free; ComponentLink1URL: https://datasheet.ciiva.com/413/xsx-mkt1-413530.pdf?src-supplier=Digi-Key; ComponentLink1Description: https://datasheet.ciiva.com/413/xsx-mkt1-413530.pdf?src-supplier=Digi-Key; Supplier Part Number 1: 200-SS126TT2; .SCHCHK: USED
footprint CON-26POS-FEMALE
pins: 1, 2, 3, 4, 5, 6, 7, 8, 9, 10, 11, 12, 13, 14, 15, 16, 17, 18, 19, 20, 21, 22, 23, 24, 25, 26

## CON-HEADER-32POS-2MM-RA
designator J?, comment 2MM
CONN HEADER R/A 32POS 2MM; Manufacturer: 3M; Manufacturer Part Number: 951126-7622-AR; Gender: Male; Number of Positions: 26; Connector Type: Male Pin; Pitch: 0.079inch; Washability: OK; .Creator: M.OZKAN; .PCBCHK: USED; Supplier 1: Mouser; Stock 1: 0; Pricing 1: 1=1,95000, 10=1,58000, 100=1,51000, 250=1,37000, 500=1,26000, 1000=1,08000 (USD); RoHS: Yes; Mount: Through Hole; Contact Plating: Gold; Color: Black; Number of Rows: 1; Termination: Solder; Package Quantity: 600; Packaging: Bulk; Contact Mating Length: 0.173inch; ComponentLink1URL: https://datasheet.ciiva.com/729/ts2156-729995.pdf?src-supplier=Digi-Key; ComponentLink1Description: https://datasheet.ciiva.com/729/ts2156-729995.pdf?src-supplier=Digi-Key; Supplier Part Number 1: 517-951126-7622-AR; .SCHCHK: USED
footprint CON-32POS-2MM
pins: 1, 2, 3, 4, 5, 6, 7, 8, 9, 10, 11, 12, 13, 14, 15, 16, 17, 18, 19, 20, 21, 22, 23, 24, 25, 26, 27, 28, 29, 30, 31, 32
